# Altium schematic symbol library Regulator_Switching.SchLib: 1070 symbols (part 7 of 9)
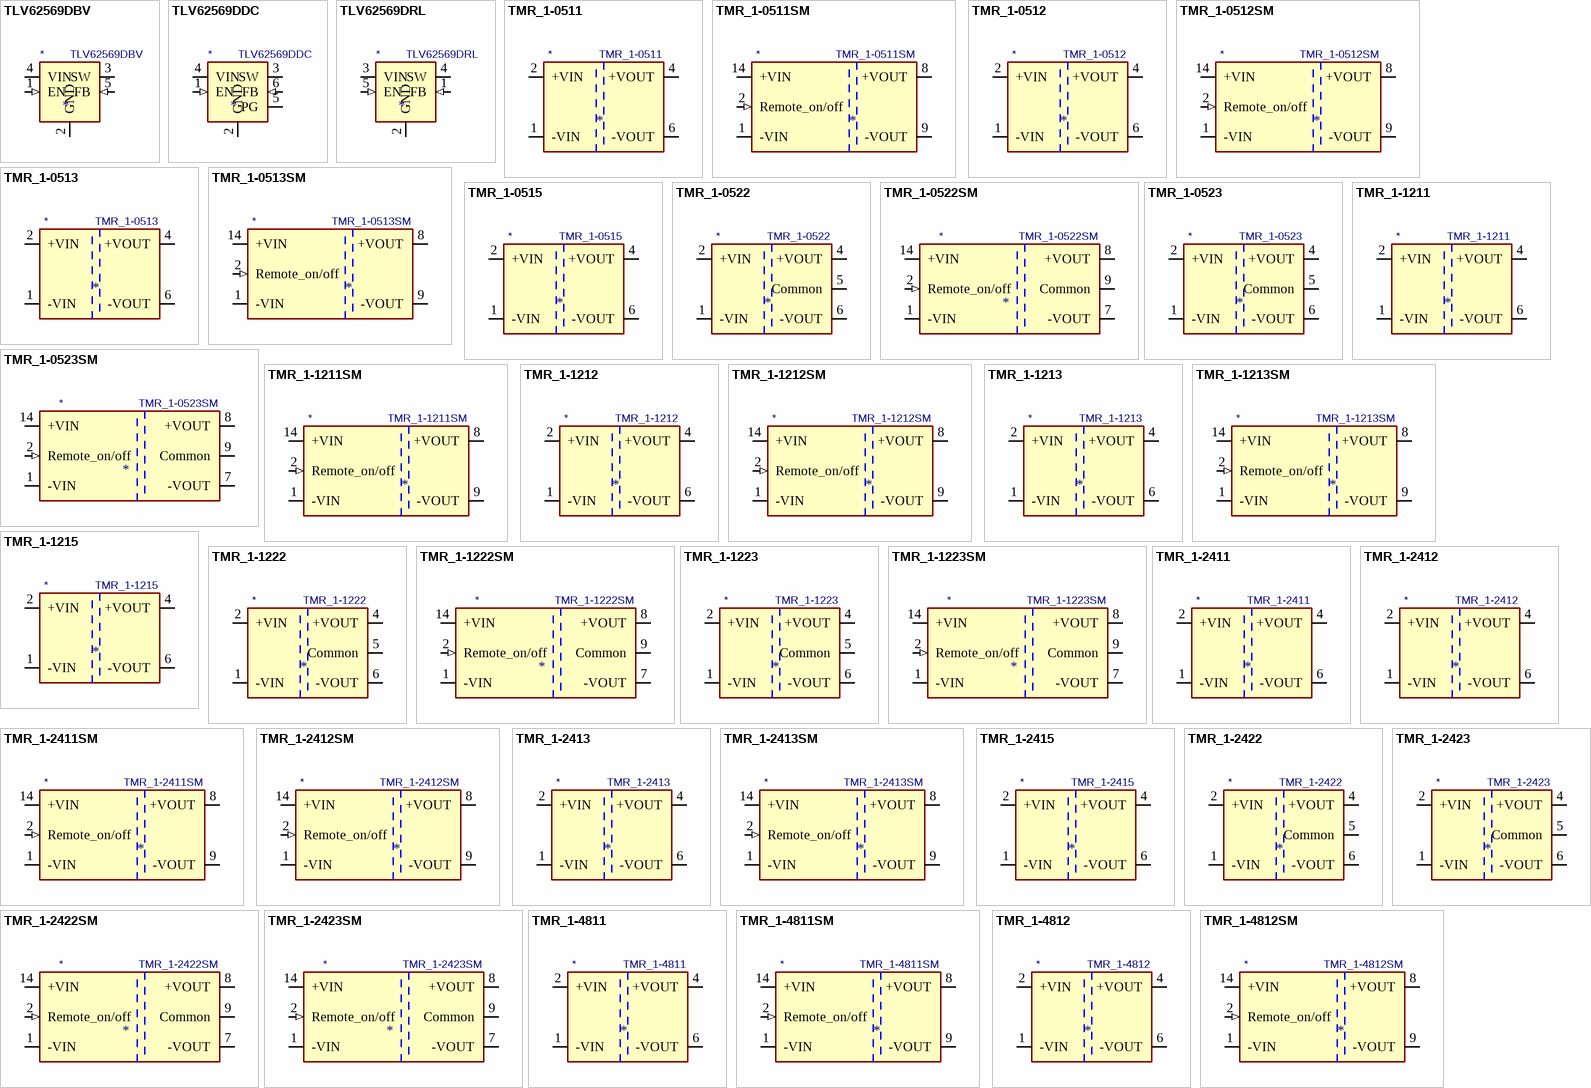
[diagram p32: symbols TLV62569DBV to TMR_1-4812SM]

## TMR_1-1222
designator *  value TMR_1-1222
ki_keywords: Murata isolated isolation dc-dc converter transformer; ki_description: +/-42mA Regulated 1W DC/DC converter with 1.5kV isolation, 9V-18V input, +/-12V fixed Output Voltage, SIP-6; ki_fp_filters: Converter*DCDC*TRACO*TMR?1*Dual*; Footprint: Converter_DCDC:Converter_DCDC_TRACO_TMR-1-xxxx_Dual_THT; Supplier: http://assets.tracopower.com/TMR1/documents/tmr1-datasheet.pdf
footprint Converter_DCDC_TRACO_TMR-1-xxxx_Dual_THT
pins: 1 -VIN (power), 2 +VIN (power), 4 +VOUT (power), 5 Common (power), 6 -VOUT (power)

## TMR_1-1222SM
designator *  value TMR_1-1222SM
ki_keywords: Murata isolated isolation dc-dc converter transformer; ki_description: +/-42mA Regulated 1W DC/DC converter with 1.5kV isolation, 9V-18V input, +/-12V fixed Output Voltage, SMD; ki_fp_filters: Converter*DCDC*TRACO*TMR-1SM*SMD*; Footprint: Converter_DCDC:Converter_DCDC_TRACO_TMR-1SM_SMD; Supplier: http://assets.tracopower.com/TMR1SM/documents/tmr1sm-datasheet.pdf
footprint Converter_DCDC_TRACO_TMR-1SM_SMD
pins: 1 -VIN (power), 2 Remote_on/off (in), 6 Common hidden, 7 -VOUT (power), 8 +VOUT (power), 9 Common (power), 14 +VIN (power)

## TMR_1-1223
designator *  value TMR_1-1223
ki_keywords: Murata isolated isolation dc-dc converter transformer; ki_description: +/-33mA Regulated 1W DC/DC converter with 1.5kV isolation, 9V-18V input, +/-15V fixed Output Voltage, SIP-6; ki_fp_filters: Converter*DCDC*TRACO*TMR?1*Dual*; Footprint: Converter_DCDC:Converter_DCDC_TRACO_TMR-1-xxxx_Dual_THT; Supplier: http://assets.tracopower.com/TMR1/documents/tmr1-datasheet.pdf
footprint Converter_DCDC_TRACO_TMR-1-xxxx_Dual_THT
pins: 1 -VIN (power), 2 +VIN (power), 4 +VOUT (power), 5 Common (power), 6 -VOUT (power)

## TMR_1-1223SM
designator *  value TMR_1-1223SM
ki_keywords: Murata isolated isolation dc-dc converter transformer; ki_description: +/-33mA Regulated 1W DC/DC converter with 1.5kV isolation, 9V-18V input, +/-15V fixed Output Voltage, SMD; ki_fp_filters: Converter*DCDC*TRACO*TMR-1SM*SMD*; Footprint: Converter_DCDC:Converter_DCDC_TRACO_TMR-1SM_SMD; Supplier: http://assets.tracopower.com/TMR1SM/documents/tmr1sm-datasheet.pdf
footprint Converter_DCDC_TRACO_TMR-1SM_SMD
pins: 1 -VIN (power), 2 Remote_on/off (in), 6 Common hidden, 7 -VOUT (power), 8 +VOUT (power), 9 Common (power), 14 +VIN (power)

## TMR_1-2411
designator *  value TMR_1-2411
ki_keywords: Murata isolated isolation dc-dc converter transformer; ki_description: 200mA Regulated 1W DC/DC converter with 1.5kV isolation, 18V-36V input, 5V fixed Output Voltage, SIP-6; ki_fp_filters: Converter*DCDC*TRACO*TMR?1*Single*; Footprint: Converter_DCDC:Converter_DCDC_TRACO_TMR-1-xxxx_Single_THT; Supplier: http://assets.tracopower.com/TMR1/documents/tmr1-datasheet.pdf
footprint Converter_DCDC_TRACO_TMR-1-xxxx_Single_THT
pins: 1 -VIN (power), 2 +VIN (power), 4 +VOUT (power), 6 -VOUT (power)

## TMR_1-2411SM
designator *  value TMR_1-2411SM
ki_keywords: Murata isolated isolation dc-dc converter transformer; ki_description: 200mA Regulated 1W DC/DC converter with 1.5kV isolation, 18V-36V input, 5V fixed Output Voltage, SMD; ki_fp_filters: Converter*DCDC*TRACO*TMR?1SM*; Footprint: Converter_DCDC:Converter_DCDC_TRACO_TMR-1SM_SMD; Supplier: http://assets.tracopower.com/TMR1SM/documents/tmr1sm-datasheet.pdf
footprint Converter_DCDC_TRACO_TMR-1SM_SMD
pins: 1 -VIN (power), 2 Remote_on/off (in), 6 NC (in) hidden, 7 NC (in) hidden, 8 +VOUT (power), 9 -VOUT (power), 14 +VIN (power)

## TMR_1-2412
designator *  value TMR_1-2412
ki_keywords: Murata isolated isolation dc-dc converter transformer; ki_description: 83mA Regulated 1W DC/DC converter with 1.5kV isolation, 18V-36V input, 12V fixed Output Voltage, SIP-6; ki_fp_filters: Converter*DCDC*TRACO*TMR?1*Single*; Footprint: Converter_DCDC:Converter_DCDC_TRACO_TMR-1-xxxx_Single_THT; Supplier: http://assets.tracopower.com/TMR1/documents/tmr1-datasheet.pdf
footprint Converter_DCDC_TRACO_TMR-1-xxxx_Single_THT
pins: 1 -VIN (power), 2 +VIN (power), 4 +VOUT (power), 6 -VOUT (power)

## TMR_1-2412SM
designator *  value TMR_1-2412SM
ki_keywords: Murata isolated isolation dc-dc converter transformer; ki_description: 83mA Regulated 1W DC/DC converter with 1.5kV isolation, 18V-36V input, 12V fixed Output Voltage, SMD; ki_fp_filters: Converter*DCDC*TRACO*TMR?1SM*; Footprint: Converter_DCDC:Converter_DCDC_TRACO_TMR-1SM_SMD; Supplier: http://assets.tracopower.com/TMR1SM/documents/tmr1sm-datasheet.pdf
footprint Converter_DCDC_TRACO_TMR-1SM_SMD
pins: 1 -VIN (power), 2 Remote_on/off (in), 6 NC (in) hidden, 7 NC (in) hidden, 8 +VOUT (power), 9 -VOUT (power), 14 +VIN (power)

## TMR_1-2413
designator *  value TMR_1-2413
ki_keywords: Murata isolated isolation dc-dc converter transformer; ki_description: 67mA Regulated 1W DC/DC converter with 1.5kV isolation, 18V-36V input, 15V fixed Output Voltage, SIP-6; ki_fp_filters: Converter*DCDC*TRACO*TMR?1*Single*; Footprint: Converter_DCDC:Converter_DCDC_TRACO_TMR-1-xxxx_Single_THT; Supplier: http://assets.tracopower.com/TMR1/documents/tmr1-datasheet.pdf
footprint Converter_DCDC_TRACO_TMR-1-xxxx_Single_THT
pins: 1 -VIN (power), 2 +VIN (power), 4 +VOUT (power), 6 -VOUT (power)

## TMR_1-2413SM
designator *  value TMR_1-2413SM
ki_keywords: Murata isolated isolation dc-dc converter transformer; ki_description: 67mA Regulated 1W DC/DC converter with 1.5kV isolation, 18V-36V input, 15V fixed Output Voltage, SMD; ki_fp_filters: Converter*DCDC*TRACO*TMR?1SM*; Footprint: Converter_DCDC:Converter_DCDC_TRACO_TMR-1SM_SMD; Supplier: http://assets.tracopower.com/TMR1SM/documents/tmr1sm-datasheet.pdf
footprint Converter_DCDC_TRACO_TMR-1SM_SMD
pins: 1 -VIN (power), 2 Remote_on/off (in), 6 NC (in) hidden, 7 NC (in) hidden, 8 +VOUT (power), 9 -VOUT (power), 14 +VIN (power)

## TMR_1-2415
designator *  value TMR_1-2415
ki_keywords: Murata isolated isolation dc-dc converter transformer; ki_description: 42mA Regulated 1W DC/DC converter with 1.5kV isolation, 18V-36V input, 24V fixed Output Voltage, SIP-6; ki_fp_filters: Converter*DCDC*TRACO*TMR?1*Single*; Footprint: Converter_DCDC:Converter_DCDC_TRACO_TMR-1-xxxx_Single_THT; Supplier: http://assets.tracopower.com/TMR1/documents/tmr1-datasheet.pdf
footprint Converter_DCDC_TRACO_TMR-1-xxxx_Single_THT
pins: 1 -VIN (power), 2 +VIN (power), 4 +VOUT (power), 6 -VOUT (power)

## TMR_1-2422
designator *  value TMR_1-2422
ki_keywords: Murata isolated isolation dc-dc converter transformer; ki_description: +/-42mA Regulated 1W DC/DC converter with 1.5kV isolation, 18V-36V input, +/-12V fixed Output Voltage, SIP-6; ki_fp_filters: Converter*DCDC*TRACO*TMR?1*Dual*; Footprint: Converter_DCDC:Converter_DCDC_TRACO_TMR-1-xxxx_Dual_THT; Supplier: http://assets.tracopower.com/TMR1/documents/tmr1-datasheet.pdf
footprint Converter_DCDC_TRACO_TMR-1-xxxx_Dual_THT
pins: 1 -VIN (power), 2 +VIN (power), 4 +VOUT (power), 5 Common (power), 6 -VOUT (power)

## TMR_1-2422SM
designator *  value TMR_1-2422SM
ki_keywords: Murata isolated isolation dc-dc converter transformer; ki_description: +/-42mA Regulated 1W DC/DC converter with 1.5kV isolation, 18V-36V input, +/-12V fixed Output Voltage, SMD; ki_fp_filters: Converter*DCDC*TRACO*TMR-1SM*SMD*; Footprint: Converter_DCDC:Converter_DCDC_TRACO_TMR-1SM_SMD; Supplier: http://assets.tracopower.com/TMR1SM/documents/tmr1sm-datasheet.pdf
footprint Converter_DCDC_TRACO_TMR-1SM_SMD
pins: 1 -VIN (power), 2 Remote_on/off (in), 6 Common hidden, 7 -VOUT (power), 8 +VOUT (power), 9 Common (power), 14 +VIN (power)

## TMR_1-2423
designator *  value TMR_1-2423
ki_keywords: Murata isolated isolation dc-dc converter transformer; ki_description: +/-33mA Regulated 1W DC/DC converter with 1.5kV isolation, 18V-36V input, +/-15V fixed Output Voltage, SIP-6; ki_fp_filters: Converter*DCDC*TRACO*TMR?1*Dual*; Footprint: Converter_DCDC:Converter_DCDC_TRACO_TMR-1-xxxx_Dual_THT; Supplier: http://assets.tracopower.com/TMR1/documents/tmr1-datasheet.pdf
footprint Converter_DCDC_TRACO_TMR-1-xxxx_Dual_THT
pins: 1 -VIN (power), 2 +VIN (power), 4 +VOUT (power), 5 Common (power), 6 -VOUT (power)

## TMR_1-2423SM
designator *  value TMR_1-2423SM
ki_keywords: Murata isolated isolation dc-dc converter transformer; ki_description: +/-33mA Regulated 1W DC/DC converter with 1.5kV isolation, 18V-36V input, +/-15V fixed Output Voltage, SMD; ki_fp_filters: Converter*DCDC*TRACO*TMR-1SM*SMD*; Footprint: Converter_DCDC:Converter_DCDC_TRACO_TMR-1SM_SMD; Supplier: http://assets.tracopower.com/TMR1SM/documents/tmr1sm-datasheet.pdf
footprint Converter_DCDC_TRACO_TMR-1SM_SMD
pins: 1 -VIN (power), 2 Remote_on/off (in), 6 Common hidden, 7 -VOUT (power), 8 +VOUT (power), 9 Common (power), 14 +VIN (power)

## TMR_1-4811
designator *  value TMR_1-4811
ki_keywords: Murata isolated isolation dc-dc converter transformer; ki_description: 200mA Regulated 1W DC/DC converter with 1.5kV isolation, 36V-75V input, 5V fixed Output Voltage, SIP-6; ki_fp_filters: Converter*DCDC*TRACO*TMR?1*Single*; Footprint: Converter_DCDC:Converter_DCDC_TRACO_TMR-1-xxxx_Single_THT; Supplier: http://assets.tracopower.com/TMR1/documents/tmr1-datasheet.pdf
footprint Converter_DCDC_TRACO_TMR-1-xxxx_Single_THT
pins: 1 -VIN (power), 2 +VIN (power), 4 +VOUT (power), 6 -VOUT (power)

## TMR_1-4811SM
designator *  value TMR_1-4811SM
ki_keywords: Murata isolated isolation dc-dc converter transformer; ki_description: 200mA Regulated 1W DC/DC converter with 1.5kV isolation, 36V-75V input, 5V fixed Output Voltage, SMD; ki_fp_filters: Converter*DCDC*TRACO*TMR?1SM*; Footprint: Converter_DCDC:Converter_DCDC_TRACO_TMR-1SM_SMD; Supplier: http://assets.tracopower.com/TMR1SM/documents/tmr1sm-datasheet.pdf
footprint Converter_DCDC_TRACO_TMR-1SM_SMD
pins: 1 -VIN (power), 2 Remote_on/off (in), 6 NC (in) hidden, 7 NC (in) hidden, 8 +VOUT (power), 9 -VOUT (power), 14 +VIN (power)

## TMR_1-4812
designator *  value TMR_1-4812
ki_keywords: Murata isolated isolation dc-dc converter transformer; ki_description: 83mA Regulated 1W DC/DC converter with 1.5kV isolation, 36V-75V input, 12V fixed Output Voltage, SIP-6; ki_fp_filters: Converter*DCDC*TRACO*TMR?1*Single*; Footprint: Converter_DCDC:Converter_DCDC_TRACO_TMR-1-xxxx_Single_THT; Supplier: http://assets.tracopower.com/TMR1/documents/tmr1-datasheet.pdf
footprint Converter_DCDC_TRACO_TMR-1-xxxx_Single_THT
pins: 1 -VIN (power), 2 +VIN (power), 4 +VOUT (power), 6 -VOUT (power)

## TMR_1-4812SM
designator *  value TMR_1-4812SM
ki_keywords: Murata isolated isolation dc-dc converter transformer; ki_description: 83mA Regulated 1W DC/DC converter with 1.5kV isolation, 36V-75V input, 12V fixed Output Voltage, SMD; ki_fp_filters: Converter*DCDC*TRACO*TMR?1SM*; Footprint: Converter_DCDC:Converter_DCDC_TRACO_TMR-1SM_SMD; Supplier: http://assets.tracopower.com/TMR1SM/documents/tmr1sm-datasheet.pdf
footprint Converter_DCDC_TRACO_TMR-1SM_SMD
pins: 1 -VIN (power), 2 Remote_on/off (in), 6 NC (in) hidden, 7 NC (in) hidden, 8 +VOUT (power), 9 -VOUT (power), 14 +VIN (power)

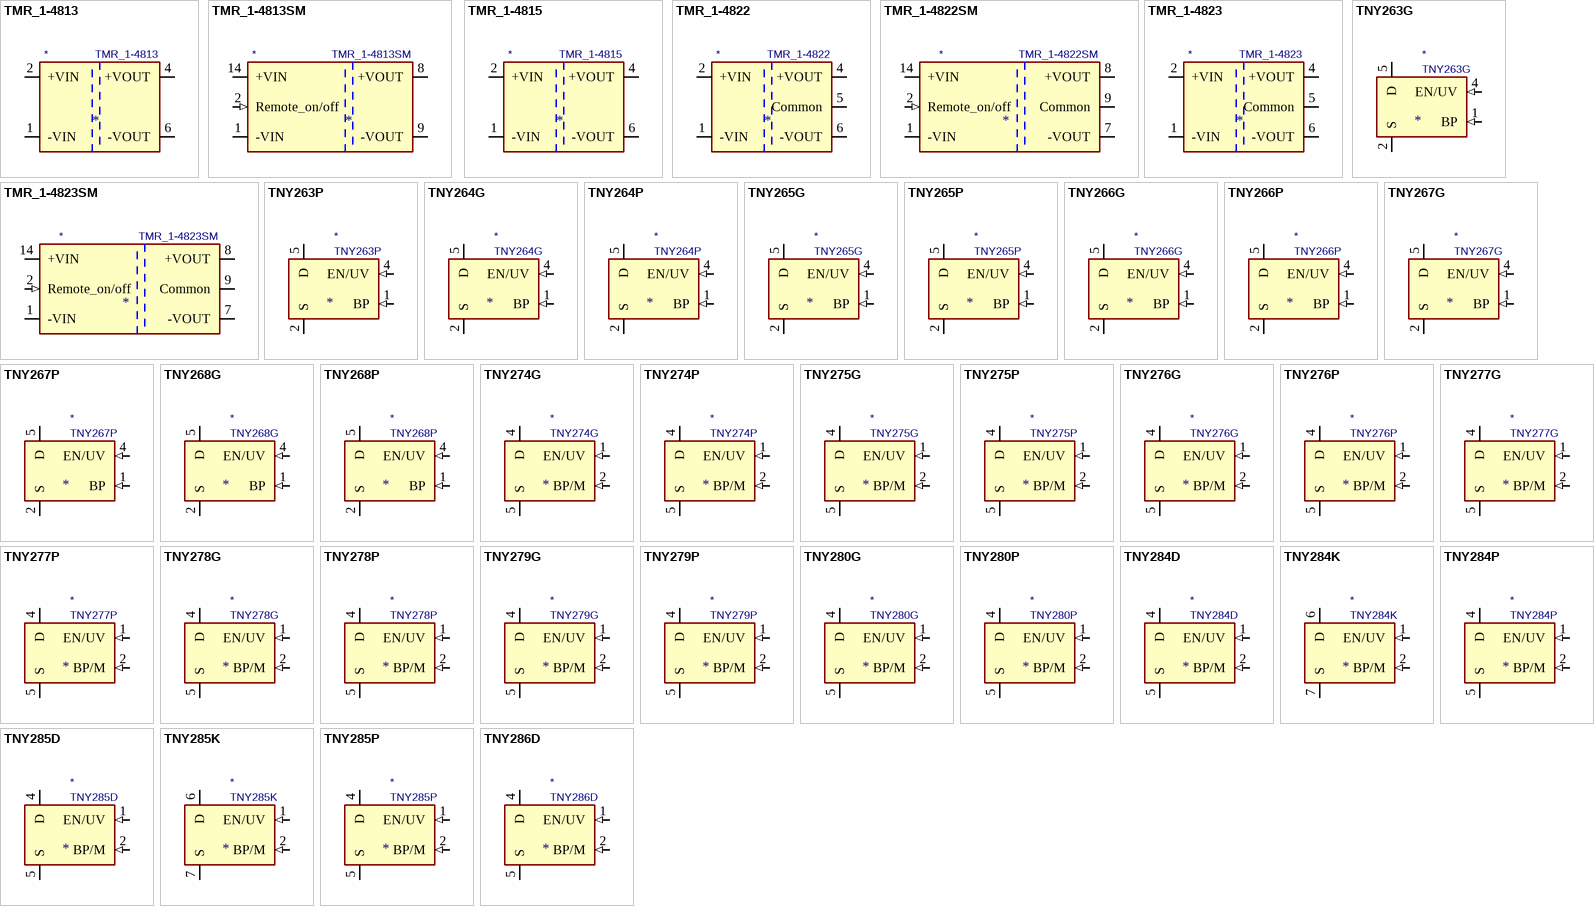
[diagram p20: symbols TMR_1-4813 to TNY286D]

## TMR_1-4813
designator *  value TMR_1-4813
ki_keywords: Murata isolated isolation dc-dc converter transformer; ki_description: 67mA Regulated 1W DC/DC converter with 1.5kV isolation, 36V-75V input, 15V fixed Output Voltage, SIP-6; ki_fp_filters: Converter*DCDC*TRACO*TMR?1*Single*; Footprint: Converter_DCDC:Converter_DCDC_TRACO_TMR-1-xxxx_Single_THT; Supplier: http://assets.tracopower.com/TMR1/documents/tmr1-datasheet.pdf
footprint Converter_DCDC_TRACO_TMR-1-xxxx_Single_THT
pins: 1 -VIN (power), 2 +VIN (power), 4 +VOUT (power), 6 -VOUT (power)

## TMR_1-4813SM
designator *  value TMR_1-4813SM
ki_keywords: Murata isolated isolation dc-dc converter transformer; ki_description: 67mA Regulated 1W DC/DC converter with 1.5kV isolation, 36V-75V input, 15V fixed Output Voltage, SMD; ki_fp_filters: Converter*DCDC*TRACO*TMR?1SM*; Footprint: Converter_DCDC:Converter_DCDC_TRACO_TMR-1SM_SMD; Supplier: http://assets.tracopower.com/TMR1SM/documents/tmr1sm-datasheet.pdf
footprint Converter_DCDC_TRACO_TMR-1SM_SMD
pins: 1 -VIN (power), 2 Remote_on/off (in), 6 NC (in) hidden, 7 NC (in) hidden, 8 +VOUT (power), 9 -VOUT (power), 14 +VIN (power)

## TMR_1-4815
designator *  value TMR_1-4815
ki_keywords: Murata isolated isolation dc-dc converter transformer; ki_description: 42mA Regulated 1W DC/DC converter with 1.5kV isolation, 36V-75V input, 24V fixed Output Voltage, SIP-6; ki_fp_filters: Converter*DCDC*TRACO*TMR?1*Single*; Footprint: Converter_DCDC:Converter_DCDC_TRACO_TMR-1-xxxx_Single_THT; Supplier: http://assets.tracopower.com/TMR1/documents/tmr1-datasheet.pdf
footprint Converter_DCDC_TRACO_TMR-1-xxxx_Single_THT
pins: 1 -VIN (power), 2 +VIN (power), 4 +VOUT (power), 6 -VOUT (power)

## TMR_1-4822
designator *  value TMR_1-4822
ki_keywords: Murata isolated isolation dc-dc converter transformer; ki_description: +/-42mA Regulated 1W DC/DC converter with 1.5kV isolation, 36V-75V input, +/-12V fixed Output Voltage, SIP-6; ki_fp_filters: Converter*DCDC*TRACO*TMR?1*Dual*; Footprint: Converter_DCDC:Converter_DCDC_TRACO_TMR-1-xxxx_Dual_THT; Supplier: http://assets.tracopower.com/TMR1/documents/tmr1-datasheet.pdf
footprint Converter_DCDC_TRACO_TMR-1-xxxx_Dual_THT
pins: 1 -VIN (power), 2 +VIN (power), 4 +VOUT (power), 5 Common (power), 6 -VOUT (power)

## TMR_1-4822SM
designator *  value TMR_1-4822SM
ki_keywords: Murata isolated isolation dc-dc converter transformer; ki_description: +/-42mA Regulated 1W DC/DC converter with 1.5kV isolation, 36V-75V input, +/-12V fixed Output Voltage, SMD; ki_fp_filters: Converter*DCDC*TRACO*TMR-1SM*SMD*; Footprint: Converter_DCDC:Converter_DCDC_TRACO_TMR-1SM_SMD; Supplier: http://assets.tracopower.com/TMR1SM/documents/tmr1sm-datasheet.pdf
footprint Converter_DCDC_TRACO_TMR-1SM_SMD
pins: 1 -VIN (power), 2 Remote_on/off (in), 6 Common hidden, 7 -VOUT (power), 8 +VOUT (power), 9 Common (power), 14 +VIN (power)

## TMR_1-4823
designator *  value TMR_1-4823
ki_keywords: Murata isolated isolation dc-dc converter transformer; ki_description: +/-33mA Regulated 1W DC/DC converter with 1.5kV isolation, 36V-75V input, +/-15V fixed Output Voltage, SIP-6; ki_fp_filters: Converter*DCDC*TRACO*TMR?1*Dual*; Footprint: Converter_DCDC:Converter_DCDC_TRACO_TMR-1-xxxx_Dual_THT; Supplier: http://assets.tracopower.com/TMR1/documents/tmr1-datasheet.pdf
footprint Converter_DCDC_TRACO_TMR-1-xxxx_Dual_THT
pins: 1 -VIN (power), 2 +VIN (power), 4 +VOUT (power), 5 Common (power), 6 -VOUT (power)

## TMR_1-4823SM
designator *  value TMR_1-4823SM
ki_keywords: Murata isolated isolation dc-dc converter transformer; ki_description: +/-33mA Regulated 1W DC/DC converter with 1.5kV isolation, 36V-75V input, +/-15V fixed Output Voltage, SMD; ki_fp_filters: Converter*DCDC*TRACO*TMR-1SM*SMD*; Footprint: Converter_DCDC:Converter_DCDC_TRACO_TMR-1SM_SMD; Supplier: http://assets.tracopower.com/TMR1SM/documents/tmr1sm-datasheet.pdf
footprint Converter_DCDC_TRACO_TMR-1SM_SMD
pins: 1 -VIN (power), 2 Remote_on/off (in), 6 Common hidden, 7 -VOUT (power), 8 +VOUT (power), 9 Common (power), 14 +VIN (power)

## TNY263G
designator *  value TNY263G
ki_keywords: Enhanced, Energy Efficient, Low Power Off-line Switcher; ki_description: TinySwitch-II Family, 4.7W Output Power, SMD-8B; ki_fp_filters: PowerIntegrations?SMD?8B*; Footprint: Package_DIP:PowerIntegrations_SMD-8B; Supplier: http://www.powerint.com/sites/default/files/product-docs/tny263_268.pdf
footprint PowerIntegrations_SMD-8B
pins: 1 BP (in), 2 S (power), 3 S hidden, 4 EN/UV (in), 5 D (oc), 7 S hidden, 8 S hidden

## TNY263P
designator *  value TNY263P
ki_keywords: Enhanced, Energy Efficient, Low Power Off-line Switcher; ki_description: TinySwitch-II Family, 4.7W Output Power, DIP-8B; ki_fp_filters: PowerIntegrations?PDIP?8B*; Footprint: Package_DIP:PowerIntegrations_PDIP-8B; Supplier: http://www.powerint.com/sites/default/files/product-docs/tny263_268.pdf
footprint PowerIntegrations_PDIP-8B
pins: 1 BP (in), 2 S (power), 3 S hidden, 4 EN/UV (in), 5 D (oc), 7 S hidden, 8 S hidden

## TNY264G
designator *  value TNY264G
ki_keywords: Enhanced, Energy Efficient, Low Power Off-line Switcher; ki_description: TinySwitch-II Family, 6W Output Power, SMD-8B; ki_fp_filters: PowerIntegrations?SMD?8B*; Footprint: Package_DIP:PowerIntegrations_SMD-8B; Supplier: http://www.powerint.com/sites/default/files/product-docs/tny263_268.pdf
footprint PowerIntegrations_SMD-8B
pins: 1 BP (in), 2 S (power), 3 S hidden, 4 EN/UV (in), 5 D (oc), 7 S hidden, 8 S hidden

## TNY264P
designator *  value TNY264P
ki_keywords: Enhanced, Energy Efficient, Low Power Off-line Switcher; ki_description: TinySwitch-II Family, 6W Output Power, DIP-8B; ki_fp_filters: PowerIntegrations?PDIP?8B*; Footprint: Package_DIP:PowerIntegrations_PDIP-8B; Supplier: http://www.powerint.com/sites/default/files/product-docs/tny263_268.pdf
footprint PowerIntegrations_PDIP-8B
pins: 1 BP (in), 2 S (power), 3 S hidden, 4 EN/UV (in), 5 D (oc), 7 S hidden, 8 S hidden

## TNY265G
designator *  value TNY265G
ki_keywords: Enhanced, Energy Efficient, Low Power Off-line Switcher; ki_description: TinySwitch-II Family, 7.5W Output Power, SMD-8B; ki_fp_filters: PowerIntegrations?SMD?8B*; Footprint: Package_DIP:PowerIntegrations_SMD-8B; Supplier: http://www.powerint.com/sites/default/files/product-docs/tny263_268.pdf
footprint PowerIntegrations_SMD-8B
pins: 1 BP (in), 2 S (power), 3 S hidden, 4 EN/UV (in), 5 D (oc), 7 S hidden, 8 S hidden

## TNY265P
designator *  value TNY265P
ki_keywords: Enhanced, Energy Efficient, Low Power Off-line Switcher; ki_description: TinySwitch-II Family, 7.5W Output Power, DIP-8B; ki_fp_filters: PowerIntegrations?PDIP?8B*; Footprint: Package_DIP:PowerIntegrations_PDIP-8B; Supplier: http://www.powerint.com/sites/default/files/product-docs/tny263_268.pdf
footprint PowerIntegrations_PDIP-8B
pins: 1 BP (in), 2 S (power), 3 S hidden, 4 EN/UV (in), 5 D (oc), 7 S hidden, 8 S hidden

## TNY266G
designator *  value TNY266G
ki_keywords: Enhanced, Energy Efficient, Low Power Off-line Switcher; ki_description: TinySwitch-II Family, 9.5W Output Power, SMD-8B; ki_fp_filters: PowerIntegrations?SMD?8B*; Footprint: Package_DIP:PowerIntegrations_SMD-8B; Supplier: http://www.powerint.com/sites/default/files/product-docs/tny263_268.pdf
footprint PowerIntegrations_SMD-8B
pins: 1 BP (in), 2 S (power), 3 S hidden, 4 EN/UV (in), 5 D (oc), 7 S hidden, 8 S hidden

## TNY266P
designator *  value TNY266P
ki_keywords: Enhanced, Energy Efficient, Low Power Off-line Switcher; ki_description: TinySwitch-II Family, 9.5W Output Power, DIP-8B; ki_fp_filters: PowerIntegrations?PDIP?8B*; Footprint: Package_DIP:PowerIntegrations_PDIP-8B; Supplier: http://www.powerint.com/sites/default/files/product-docs/tny263_268.pdf
footprint PowerIntegrations_PDIP-8B
pins: 1 BP (in), 2 S (power), 3 S hidden, 4 EN/UV (in), 5 D (oc), 7 S hidden, 8 S hidden

## TNY267G
designator *  value TNY267G
ki_keywords: Enhanced, Energy Efficient, Low Power Off-line Switcher; ki_description: TinySwitch-II Family, 12W Output Power, SMD-8B; ki_fp_filters: PowerIntegrations?SMD?8B*; Footprint: Package_DIP:PowerIntegrations_SMD-8B; Supplier: http://www.powerint.com/sites/default/files/product-docs/tny263_268.pdf
footprint PowerIntegrations_SMD-8B
pins: 1 BP (in), 2 S (power), 3 S hidden, 4 EN/UV (in), 5 D (oc), 7 S hidden, 8 S hidden

## TNY267P
designator *  value TNY267P
ki_keywords: Enhanced, Energy Efficient, Low Power Off-line Switcher; ki_description: TinySwitch-II Family, 12W Output Power, DIP-8B; ki_fp_filters: PowerIntegrations?PDIP?8B*; Footprint: Package_DIP:PowerIntegrations_PDIP-8B; Supplier: http://www.powerint.com/sites/default/files/product-docs/tny263_268.pdf
footprint PowerIntegrations_PDIP-8B
pins: 1 BP (in), 2 S (power), 3 S hidden, 4 EN/UV (in), 5 D (oc), 7 S hidden, 8 S hidden

## TNY268G
designator *  value TNY268G
ki_keywords: Enhanced, Energy Efficient, Low Power Off-line Switcher; ki_description: TinySwitch-II Family, 15W Output Power, SMD-8B; ki_fp_filters: PowerIntegrations?SMD?8B*; Footprint: Package_DIP:PowerIntegrations_SMD-8B; Supplier: http://www.powerint.com/sites/default/files/product-docs/tny263_268.pdf
footprint PowerIntegrations_SMD-8B
pins: 1 BP (in), 2 S (power), 3 S hidden, 4 EN/UV (in), 5 D (oc), 7 S hidden, 8 S hidden

## TNY268P
designator *  value TNY268P
ki_keywords: Enhanced, Energy Efficient, Low Power Off-line Switcher; ki_description: TinySwitch-II Family, 15W Output Power, DIP-8B; ki_fp_filters: PowerIntegrations?PDIP?8B*; Footprint: Package_DIP:PowerIntegrations_PDIP-8B; Supplier: http://www.powerint.com/sites/default/files/product-docs/tny263_268.pdf
footprint PowerIntegrations_PDIP-8B
pins: 1 BP (in), 2 S (power), 3 S hidden, 4 EN/UV (in), 5 D (oc), 7 S hidden, 8 S hidden

## TNY274G
designator *  value TNY274G
ki_keywords: Energy-Efficient, Off-Line Switcher With Enhanced Flexibility and Extended Power Range; ki_description: TinySwitch-III Family, 8.5W Output Power, SMD-8C; ki_fp_filters: PowerIntegrations?SMD?8C*; Footprint: Package_DIP:PowerIntegrations_SMD-8C; Supplier: http://www.powerint.com/sites/default/files/product-docs/tny274-280.pdf
footprint PowerIntegrations_SMD-8C
pins: 1 EN/UV (in), 2 BP/M (in), 4 D (oc), 5 S (power), 6 S hidden, 7 S hidden, 8 S hidden

## TNY274P
designator *  value TNY274P
ki_keywords: Energy-Efficient, Off-Line Switcher With Enhanced Flexibility and Extended Power Range; ki_description: TinySwitch-III Family, 8.5W Output Power, DIP-8C; ki_fp_filters: PowerIntegrations?PDIP?8C*; Footprint: Package_DIP:PowerIntegrations_PDIP-8C; Supplier: http://www.powerint.com/sites/default/files/product-docs/tny274-280.pdf
footprint PowerIntegrations_PDIP-8C
pins: 1 EN/UV (in), 2 BP/M (in), 4 D (oc), 5 S (power), 6 S hidden, 7 S hidden, 8 S hidden

## TNY275G
designator *  value TNY275G
ki_keywords: Energy-Efficient, Off-Line Switcher With Enhanced Flexibility and Extended Power Range; ki_description: TinySwitch-III Family, 11.5W Output Power, SMD-8C; ki_fp_filters: PowerIntegrations?SMD?8C*; Footprint: Package_DIP:PowerIntegrations_SMD-8C; Supplier: http://www.powerint.com/sites/default/files/product-docs/tny274-280.pdf
footprint PowerIntegrations_SMD-8C
pins: 1 EN/UV (in), 2 BP/M (in), 4 D (oc), 5 S (power), 6 S hidden, 7 S hidden, 8 S hidden

## TNY275P
designator *  value TNY275P
ki_keywords: Energy-Efficient, Off-Line Switcher With Enhanced Flexibility and Extended Power Range; ki_description: TinySwitch-III Family, 11.5W Output Power, DIP-8C; ki_fp_filters: PowerIntegrations?PDIP?8C*; Footprint: Package_DIP:PowerIntegrations_PDIP-8C; Supplier: http://www.powerint.com/sites/default/files/product-docs/tny274-280.pdf
footprint PowerIntegrations_PDIP-8C
pins: 1 EN/UV (in), 2 BP/M (in), 4 D (oc), 5 S (power), 6 S hidden, 7 S hidden, 8 S hidden

## TNY276G
designator *  value TNY276G
ki_keywords: Energy-Efficient, Off-Line Switcher With Enhanced Flexibility and Extended Power Range; ki_description: TinySwitch-III Family, 15W Output Power, SMD-8C; ki_fp_filters: PowerIntegrations?SMD?8C*; Footprint: Package_DIP:PowerIntegrations_SMD-8C; Supplier: http://www.powerint.com/sites/default/files/product-docs/tny274-280.pdf
footprint PowerIntegrations_SMD-8C
pins: 1 EN/UV (in), 2 BP/M (in), 4 D (oc), 5 S (power), 6 S hidden, 7 S hidden, 8 S hidden

## TNY276P
designator *  value TNY276P
ki_keywords: Energy-Efficient, Off-Line Switcher With Enhanced Flexibility and Extended Power Range; ki_description: TinySwitch-III Family, 15W Output Power, DIP-8C; ki_fp_filters: PowerIntegrations?PDIP?8C*; Footprint: Package_DIP:PowerIntegrations_PDIP-8C; Supplier: http://www.powerint.com/sites/default/files/product-docs/tny274-280.pdf
footprint PowerIntegrations_PDIP-8C
pins: 1 EN/UV (in), 2 BP/M (in), 4 D (oc), 5 S (power), 6 S hidden, 7 S hidden, 8 S hidden

## TNY277G
designator *  value TNY277G
ki_keywords: Energy-Efficient, Off-Line Switcher With Enhanced Flexibility and Extended Power Range; ki_description: TinySwitch-III Family, 18W Output Power, SMD-8C; ki_fp_filters: PowerIntegrations?SMD?8C*; Footprint: Package_DIP:PowerIntegrations_SMD-8C; Supplier: http://www.powerint.com/sites/default/files/product-docs/tny274-280.pdf
footprint PowerIntegrations_SMD-8C
pins: 1 EN/UV (in), 2 BP/M (in), 4 D (oc), 5 S (power), 6 S hidden, 7 S hidden, 8 S hidden

## TNY277P
designator *  value TNY277P
ki_keywords: Energy-Efficient, Off-Line Switcher With Enhanced Flexibility and Extended Power Range; ki_description: TinySwitch-III Family, 18W Output Power, DIP-8C; ki_fp_filters: PowerIntegrations?PDIP?8C*; Footprint: Package_DIP:PowerIntegrations_PDIP-8C; Supplier: http://www.powerint.com/sites/default/files/product-docs/tny274-280.pdf
footprint PowerIntegrations_PDIP-8C
pins: 1 EN/UV (in), 2 BP/M (in), 4 D (oc), 5 S (power), 6 S hidden, 7 S hidden, 8 S hidden

## TNY278G
designator *  value TNY278G
ki_keywords: Energy-Efficient, Off-Line Switcher With Enhanced Flexibility and Extended Power Range; ki_description: TinySwitch-III Family, 21.5W Output Power, SMD-8C; ki_fp_filters: PowerIntegrations?SMD?8C*; Footprint: Package_DIP:PowerIntegrations_SMD-8C; Supplier: http://www.powerint.com/sites/default/files/product-docs/tny274-280.pdf
footprint PowerIntegrations_SMD-8C
pins: 1 EN/UV (in), 2 BP/M (in), 4 D (oc), 5 S (power), 6 S hidden, 7 S hidden, 8 S hidden

## TNY278P
designator *  value TNY278P
ki_keywords: Energy-Efficient, Off-Line Switcher With Enhanced Flexibility and Extended Power Range; ki_description: TinySwitch-III Family, 21.5W Output Power, DIP-8C; ki_fp_filters: PowerIntegrations?PDIP?8C*; Footprint: Package_DIP:PowerIntegrations_PDIP-8C; Supplier: http://www.powerint.com/sites/default/files/product-docs/tny274-280.pdf
footprint PowerIntegrations_PDIP-8C
pins: 1 EN/UV (in), 2 BP/M (in), 4 D (oc), 5 S (power), 6 S hidden, 7 S hidden, 8 S hidden

## TNY279G
designator *  value TNY279G
ki_keywords: Energy-Efficient, Off-Line Switcher With Enhanced Flexibility and Extended Power Range; ki_description: TinySwitch-III Family, 25W Output Power, SMD-8C; ki_fp_filters: PowerIntegrations?SMD?8C*; Footprint: Package_DIP:PowerIntegrations_SMD-8C; Supplier: http://www.powerint.com/sites/default/files/product-docs/tny274-280.pdf
footprint PowerIntegrations_SMD-8C
pins: 1 EN/UV (in), 2 BP/M (in), 4 D (oc), 5 S (power), 6 S hidden, 7 S hidden, 8 S hidden

## TNY279P
designator *  value TNY279P
ki_keywords: Energy-Efficient, Off-Line Switcher With Enhanced Flexibility and Extended Power Range; ki_description: TinySwitch-III Family, 25W Output Power, DIP-8C; ki_fp_filters: PowerIntegrations?PDIP?8C*; Footprint: Package_DIP:PowerIntegrations_PDIP-8C; Supplier: http://www.powerint.com/sites/default/files/product-docs/tny274-280.pdf
footprint PowerIntegrations_PDIP-8C
pins: 1 EN/UV (in), 2 BP/M (in), 4 D (oc), 5 S (power), 6 S hidden, 7 S hidden, 8 S hidden

## TNY280G
designator *  value TNY280G
ki_keywords: Energy-Efficient, Off-Line Switcher With Enhanced Flexibility and Extended Power Range; ki_description: TinySwitch-III Family, 28.5W Output Power, SMD-8C; ki_fp_filters: PowerIntegrations?SMD?8C*; Footprint: Package_DIP:PowerIntegrations_SMD-8C; Supplier: http://www.powerint.com/sites/default/files/product-docs/tny274-280.pdf
footprint PowerIntegrations_SMD-8C
pins: 1 EN/UV (in), 2 BP/M (in), 4 D (oc), 5 S (power), 6 S hidden, 7 S hidden, 8 S hidden

## TNY280P
designator *  value TNY280P
ki_keywords: Energy-Efficient, Off-Line Switcher With Enhanced Flexibility and Extended Power Range; ki_description: TinySwitch-III Family, 28.5W Output Power, DIP-8C; ki_fp_filters: PowerIntegrations?PDIP?8C*; Footprint: Package_DIP:PowerIntegrations_PDIP-8C; Supplier: http://www.powerint.com/sites/default/files/product-docs/tny274-280.pdf
footprint PowerIntegrations_PDIP-8C
pins: 1 EN/UV (in), 2 BP/M (in), 4 D (oc), 5 S (power), 6 S hidden, 7 S hidden, 8 S hidden

## TNY284D
designator *  value TNY284D
ki_keywords: Energy-Efficient, Off-Line Switcher With Line Compensated Overload Power; ki_description: TinySwitch-4 Family, 8.5W Output Power, SO-8C; ki_fp_filters: PowerIntegrations?SO?8C*; Footprint: Package_SO:PowerIntegrations_SO-8C; Supplier: https://ac-dc.power.com/sites/default/files/product-docs/tinyswitch-4_family_datasheet.pdf
footprint PowerIntegrations_SO-8C
pins: 1 EN/UV (in), 2 BP/M (in), 4 D (oc), 5 S (power), 6 S hidden, 7 S hidden, 8 S hidden

## TNY284K
designator *  value TNY284K
ki_keywords: Energy-Efficient, Off-Line Switcher With Line Compensated Overload Power; ki_description: TinySwitch-4 Family, 8.5W Output Power, eSOP-12B; ki_fp_filters: PowerIntegrations?eSOP?12B*; Footprint: Package_SO:PowerIntegrations_eSOP-12B; Supplier: https://ac-dc.power.com/sites/default/files/product-docs/tinyswitch-4_family_datasheet.pdf
footprint PowerIntegrations_eSOP-12B
pins: 1 EN/UV (in), 2 BP/M (in), 3 NC (in) hidden, 4 NC (in) hidden, 6 D (oc), 7 S (power), 8 S hidden, 9 S hidden, 10 S hidden, 11 S hidden, 12 S hidden, 13 S hidden

## TNY284P
designator *  value TNY284P
ki_keywords: Energy-Efficient, Off-Line Switcher With Line Compensated Overload Power; ki_description: TinySwitch-4 Family, 8.5W Output Power, PDIP-8C; ki_fp_filters: PowerIntegrations?PDIP?8C*; Footprint: Package_DIP:PowerIntegrations_PDIP-8C; Supplier: https://ac-dc.power.com/sites/default/files/product-docs/tinyswitch-4_family_datasheet.pdf
footprint PowerIntegrations_PDIP-8C
pins: 1 EN/UV (in), 2 BP/M (in), 4 D (oc), 5 S (power), 6 S hidden, 7 S hidden, 8 S hidden

## TNY285D
designator *  value TNY285D
ki_keywords: Energy-Efficient, Off-Line Switcher With Line Compensated Overload Power; ki_description: TinySwitch-4 Family, 11.5W Output Power, SO-8C; ki_fp_filters: PowerIntegrations?SO?8C*; Footprint: Package_SO:PowerIntegrations_SO-8C; Supplier: https://ac-dc.power.com/sites/default/files/product-docs/tinyswitch-4_family_datasheet.pdf
footprint PowerIntegrations_SO-8C
pins: 1 EN/UV (in), 2 BP/M (in), 4 D (oc), 5 S (power), 6 S hidden, 7 S hidden, 8 S hidden

## TNY285K
designator *  value TNY285K
ki_keywords: Energy-Efficient, Off-Line Switcher With Line Compensated Overload Power; ki_description: TinySwitch-4 Family, 11.5W Output Power, eSOP-12B; ki_fp_filters: PowerIntegrations?eSOP?12B*; Footprint: Package_SO:PowerIntegrations_eSOP-12B; Supplier: https://ac-dc.power.com/sites/default/files/product-docs/tinyswitch-4_family_datasheet.pdf
footprint PowerIntegrations_eSOP-12B
pins: 1 EN/UV (in), 2 BP/M (in), 3 NC (in) hidden, 4 NC (in) hidden, 6 D (oc), 7 S (power), 8 S hidden, 9 S hidden, 10 S hidden, 11 S hidden, 12 S hidden, 13 S hidden

## TNY285P
designator *  value TNY285P
ki_keywords: Energy-Efficient, Off-Line Switcher With Line Compensated Overload Power; ki_description: TinySwitch-4 Family, 11.5W Output Power, PDIP-8C; ki_fp_filters: PowerIntegrations?PDIP?8C*; Footprint: Package_DIP:PowerIntegrations_PDIP-8C; Supplier: https://ac-dc.power.com/sites/default/files/product-docs/tinyswitch-4_family_datasheet.pdf
footprint PowerIntegrations_PDIP-8C
pins: 1 EN/UV (in), 2 BP/M (in), 4 D (oc), 5 S (power), 6 S hidden, 7 S hidden, 8 S hidden

## TNY286D
designator *  value TNY286D
ki_keywords: Energy-Efficient, Off-Line Switcher With Line Compensated Overload Power; ki_description: TinySwitch-4 Family, 15W Output Power, SO-8C; ki_fp_filters: PowerIntegrations?SO?8C*; Footprint: Package_SO:PowerIntegrations_SO-8C; Supplier: https://ac-dc.power.com/sites/default/files/product-docs/tinyswitch-4_family_datasheet.pdf
footprint PowerIntegrations_SO-8C
pins: 1 EN/UV (in), 2 BP/M (in), 4 D (oc), 5 S (power), 6 S hidden, 7 S hidden, 8 S hidden
